# Altium footprint library ST封装.PcbLib: 1336 footprints (part 26 of 109) (continued)
## BGA127P39X39-1521 [mm] "BGA, 1521-Leads, Body 50x50mm, Pitch 1.27mm" (continued)
K35(19.05,12.7) K36(20.32,12.7) K37(21.59,12.7) K38(22.86,12.7) K39(24.13,12.7) L1(-24.13,11.43) L2(-22.86,11.43) L3(-21.59,11.43) L4(-20.32,11.43) L5(-19.05,11.43) L6(-17.78,11.43) L7(-16.51,11.43) L8(-15.24,11.43) L9(-13.97,11.43) L10(-12.7,11.43) L11(-11.43,11.43) L12(-10.16,11.43) L13(-8.89,11.43) L14(-7.62,11.43) L15(-6.35,11.43) L16(-5.08,11.43) L17(-3.81,11.43) L18(-2.54,11.43) L19(-1.27,11.43) L20(0,11.43) L21(1.27,11.43) L22(2.54,11.43) L23(3.81,11.43) L24(5.08,11.43) L25(6.35,11.43) L26(7.62,11.43) L27(8.89,11.43) L28(10.16,11.43) L29(11.43,11.43) L30(12.7,11.43) L31(13.97,11.43) L32(15.24,11.43) L33(16.51,11.43) L34(17.78,11.43) L35(19.05,11.43) L36(20.32,11.43) L37(21.59,11.43) L38(22.86,11.43) L39(24.13,11.43) M1(-24.13,10.16) M2(-22.86,10.16) M3(-21.59,10.16) M4(-20.32,10.16) M5(-19.05,10.16) M6(-17.78,10.16) M7(-16.51,10.16) M8(-15.24,10.16) M9(-13.97,10.16) M10(-12.7,10.16) M11(-11.43,10.16) M12(-10.16,10.16) M13(-8.89,10.16) M14(-7.62,10.16) M15(-6.35,10.16) M16(-5.08,10.16) M17(-3.81,10.16) M18(-2.54,10.16) M19(-1.27,10.16) M20(0,10.16) M21(1.27,10.16) M22(2.54,10.16) M23(3.81,10.16) M24(5.08,10.16) M25(6.35,10.16) M26(7.62,10.16) M27(8.89,10.16) M28(10.16,10.16) M29(11.43,10.16) M30(12.7,10.16) M31(13.97,10.16) M32(15.24,10.16) M33(16.51,10.16) M34(17.78,10.16) M35(19.05,10.16) M36(20.32,10.16) M37(21.59,10.16) M38(22.86,10.16) M39(24.13,10.16) N1(-24.13,8.89) N2(-22.86,8.89) N3(-21.59,8.89) N4(-20.32,8.89) N5(-19.05,8.89) N6(-17.78,8.89) N7(-16.51,8.89) N8(-15.24,8.89) N9(-13.97,8.89) N10(-12.7,8.89) N11(-11.43,8.89) N12(-10.16,8.89) N13(-8.89,8.89) N14(-7.62,8.89) N15(-6.35,8.89) N16(-5.08,8.89) N17(-3.81,8.89) N18(-2.54,8.89) N19(-1.27,8.89) N20(0,8.89) N21(1.27,8.89) N22(2.54,8.89) N23(3.81,8.89) N24(5.08,8.89) N25(6.35,8.89) N26(7.62,8.89) N27(8.89,8.89) N28(10.16,8.89) N29(11.43,8.89) N30(12.7,8.89) N31(13.97,8.89) N32(15.24,8.89) N33(16.51,8.89) N34(17.78,8.89) N35(19.05,8.89) N36(20.32,8.89) N37(21.59,8.89) N38(22.86,8.89) N39(24.13,8.89) P1(-24.13,7.62) P2(-22.86,7.62) P3(-21.59,7.62) P4(-20.32,7.62) P5(-19.05,7.62) P6(-17.78,7.62) P7(-16.51,7.62) P8(-15.24,7.62) P9(-13.97,7.62) P10(-12.7,7.62) P11(-11.43,7.62) P12(-10.16,7.62) P13(-8.89,7.62) P14(-7.62,7.62) P15(-6.35,7.62) P16(-5.08,7.62) P17(-3.81,7.62) P18(-2.54,7.62) P19(-1.27,7.62) P20(0,7.62) P21(1.27,7.62) P22(2.54,7.62) P23(3.81,7.62) P24(5.08,7.62) P25(6.35,7.62) P26(7.62,7.62) P27(8.89,7.62) P28(10.16,7.62) P29(11.43,7.62) P30(12.7,7.62) P31(13.97,7.62) P32(15.24,7.62) P33(16.51,7.62) P34(17.78,7.62) P35(19.05,7.62) P36(20.32,7.62) P37(21.59,7.62) P38(22.86,7.62) P39(24.13,7.62) R1(-24.13,6.35) R2(-22.86,6.35) R3(-21.59,6.35) R4(-20.32,6.35) R5(-19.05,6.35) R6(-17.78,6.35) R7(-16.51,6.35) R8(-15.24,6.35) R9(-13.97,6.35) R10(-12.7,6.35) R11(-11.43,6.35) R12(-10.16,6.35) R13(-8.89,6.35) R14(-7.62,6.35) R15(-6.35,6.35) R16(-5.08,6.35) R17(-3.81,6.35) R18(-2.54,6.35) R19(-1.27,6.35) R20(0,6.35) R21(1.27,6.35) R22(2.54,6.35) R23(3.81,6.35) R24(5.08,6.35) R25(6.35,6.35) R26(7.62,6.35) R27(8.89,6.35) R28(10.16,6.35) R29(11.43,6.35) R30(12.7,6.35) R31(13.97,6.35) R32(15.24,6.35) R33(16.51,6.35) R34(17.78,6.35) R35(19.05,6.35) R36(20.32,6.35) R37(21.59,6.35) R38(22.86,6.35) R39(24.13,6.35) T1(-24.13,5.08) T2(-22.86,5.08) T3(-21.59,5.08) T4(-20.32,5.08) T5(-19.05,5.08) T6(-17.78,5.08) T7(-16.51,5.08) T8(-15.24,5.08) T9(-13.97,5.08) T10(-12.7,5.08) T11(-11.43,5.08) T12(-10.16,5.08) T13(-8.89,5.08) T14(-7.62,5.08) T15(-6.35,5.08) T16(-5.08,5.08) T17(-3.81,5.08) T18(-2.54,5.08) T19(-1.27,5.08) T20(0,5.08) T21(1.27,5.08) T22(2.54,5.08) T23(3.81,5.08) T24(5.08,5.08) T25(6.35,5.08) T26(7.62,5.08) T27(8.89,5.08) T28(10.16,5.08) T29(11.43,5.08) T30(12.7,5.08) T31(13.97,5.08) T32(15.24,5.08) T33(16.51,5.08) T34(17.78,5.08) T35(19.05,5.08) T36(20.32,5.08) T37(21.59,5.08) T38(22.86,5.08) T39(24.13,5.08) U1(-24.13,3.81) U2(-22.86,3.81) U3(-21.59,3.81) U4(-20.32,3.81) U5(-19.05,3.81) U6(-17.78,3.81) U7(-16.51,3.81) U8(-15.24,3.81) U9(-13.97,3.81) U10(-12.7,3.81) U11(-11.43,3.81) U12(-10.16,3.81) U13(-8.89,3.81) U14(-7.62,3.81) U15(-6.35,3.81) U16(-5.08,3.81) U17(-3.81,3.81) U18(-2.54,3.81) U19(-1.27,3.81) U20(0,3.81) U21(1.27,3.81) U22(2.54,3.81) U23(3.81,3.81) U24(5.08,3.81) U25(6.35,3.81) U26(7.62,3.81) U27(8.89,3.81) U28(10.16,3.81) U29(11.43,3.81) U30(12.7,3.81) U31(13.97,3.81) U32(15.24,3.81) U33(16.51,3.81) U34(17.78,3.81) U35(19.05,3.81) U36(20.32,3.81) U37(21.59,3.81) U38(22.86,3.81) U39(24.13,3.81) V1(-24.13,2.54) V2(-22.86,2.54) V3(-21.59,2.54) V4(-20.32,2.54) V5(-19.05,2.54) V6(-17.78,2.54) V7(-16.51,2.54) V8(-15.24,2.54) V9(-13.97,2.54) V10(-12.7,2.54) V11(-11.43,2.54) V12(-10.16,2.54) V13(-8.89,2.54) V14(-7.62,2.54) V15(-6.35,2.54) V16(-5.08,2.54) V17(-3.81,2.54) V18(-2.54,2.54) V19(-1.27,2.54) V20(0,2.54) V21(1.27,2.54) V22(2.54,2.54) V23(3.81,2.54) V24(5.08,2.54) V25(6.35,2.54) V26(7.62,2.54) V27(8.89,2.54) V28(10.16,2.54) V29(11.43,2.54) V30(12.7,2.54) V31(13.97,2.54) V32(15.24,2.54) V33(16.51,2.54) V34(17.78,2.54) V35(19.05,2.54) V36(20.32,2.54) V37(21.59,2.54) V38(22.86,2.54) V39(24.13,2.54) W1(-24.13,1.27) W2(-22.86,1.27) W3(-21.59,1.27) W4(-20.32,1.27) W5(-19.05,1.27) W6(-17.78,1.27) W7(-16.51,1.27) W8(-15.24,1.27) W9(-13.97,1.27) W10(-12.7,1.27) W11(-11.43,1.27) W12(-10.16,1.27) W13(-8.89,1.27) W14(-7.62,1.27) W15(-6.35,1.27) W16(-5.08,1.27) W17(-3.81,1.27) W18(-2.54,1.27) W19(-1.27,1.27) W20(0,1.27) W21(1.27,1.27) W22(2.54,1.27) W23(3.81,1.27) W24(5.08,1.27) W25(6.35,1.27) W26(7.62,1.27) W27(8.89,1.27) W28(10.16,1.27) W29(11.43,1.27) W30(12.7,1.27) W31(13.97,1.27) W32(15.24,1.27) W33(16.51,1.27) W34(17.78,1.27) W35(19.05,1.27) W36(20.32,1.27) W37(21.59,1.27) W38(22.86,1.27) W39(24.13,1.27) Y1(-24.13,0) Y2(-22.86,0) Y3(-21.59,0) Y4(-20.32,0) Y5(-19.05,0) Y6(-17.78,0) Y7(-16.51,0) Y8(-15.24,0) Y9(-13.97,0) Y10(-12.7,0) Y11(-11.43,0) Y12(-10.16,0) Y13(-8.89,0) Y14(-7.62,0) Y15(-6.35,0) Y16(-5.08,0) Y17(-3.81,0) Y18(-2.54,0) Y19(-1.27,0) Y20(0,0) Y21(1.27,0) Y22(2.54,0) Y23(3.81,0) Y24(5.08,0) Y25(6.35,0) Y26(7.62,0) Y27(8.89,0) Y28(10.16,0) Y29(11.43,0) Y30(12.7,0) Y31(13.97,0) Y32(15.24,0) Y33(16.51,0) Y34(17.78,0) Y35(19.05,0) Y36(20.32,0) Y37(21.59,0) Y38(22.86,0) Y39(24.13,0)
Top Overlay:
  circle w0.25: c-25.65,24.13 r0.125
  region: -24.25,25 -25,24.25 -25,25
  lines w0.2: -25,24.25 -24.25,25 ; -25,-25 -25,25 25,25 25,-25 -25,-25
Mechanical 13:
  lines w0.1: -25,-25 -25,25 25,25 25,-25 -25,-25
Mechanical 15:
  lines w0.1: -0.5,0 0.5,0 ; 0,-0.5 0,0.5 ; -26,-26 -26,26 26,26 26,-26 -26,-26
3D body: height 3.5, standoff 0, extent -25,-25 25,25

## BGA150P3X3-9 [mm] "BGA, 9-Leads, Body 7x7mm, Pitch 1.5mm"
height 3.5
pads (9):
  round 0.6 smd: A1(-1.5,1.5) A2(0,1.5) A3(1.5,1.5) B1(-1.5,0) B2(0,0) B3(1.5,0) C1(-1.5,-1.5) C2(0,-1.5) C3(1.5,-1.5)
Top Overlay:
  circle w0.25: c-4.15,1.5 r0.125
  region: -2.5,3.5 -3.5,2.5 -3.5,3.5
  lines w0.2: -3.5,2.5 -2.5,3.5 ; -3.5,-3.5 3.5,-3.5 3.5,3.5 -3.5,3.5 -3.5,-3.5
Mechanical 13:
  lines w0.1: -3.5,-3.5 3.5,-3.5 3.5,3.5 -3.5,3.5 -3.5,-3.5
Mechanical 15:
  lines w0.1: -0.5,0 0.5,0 ; 0,-0.5 0,0.5 ; -4.5,-4.5 4.5,-4.5 4.5,4.5 -4.5,4.5 -4.5,-4.5
3D body: height 3.5, standoff 0, extent -3.5,-3.5 3.5,3.5

## BGA150P4X4-16 [mm] "BGA, 16-Leads, Body 7x7mm, Pitch 1.5mm"
height 3.5
pads (16):
  round 0.6 smd: A1(-2.25,2.25) A2(-0.75,2.25) A3(0.75,2.25) A4(2.25,2.25) B1(-2.25,0.75) B2(-0.75,0.75) B3(0.75,0.75) B4(2.25,0.75) C1(-2.25,-0.75) C2(-0.75,-0.75) C3(0.75,-0.75) C4(2.25,-0.75) D1(-2.25,-2.25) D2(-0.75,-2.25) D3(0.75,-2.25) D4(2.25,-2.25)
Top Overlay:
  circle w0.25: c-4.15,2.25 r0.125
  region: -2.5,3.5 -3.5,2.5 -3.5,3.5
  lines w0.2: -3.5,2.5 -2.5,3.5 ; -3.5,-3.5 -3.5,3.5 3.5,3.5 3.5,-3.5 -3.5,-3.5
Mechanical 13:
  lines w0.1: -3.5,-3.5 -3.5,3.5 3.5,3.5 3.5,-3.5 -3.5,-3.5
Mechanical 15:
  lines w0.1: -0.5,0 0.5,0 ; 0,-0.5 0,0.5 ; -4.5,-4.5 -4.5,4.5 4.5,4.5 4.5,-4.5 -4.5,-4.5
3D body: height 3.5, standoff 0, extent -3.5,-3.5 3.5,3.5

## BGA150P4X4-16A [mm] "BGA, 16-Leads, Body 8x8mm, Pitch 1.5mm"
height 3.5
pads (16):
  round 0.6 smd: A1(-2.25,2.25) A2(-0.75,2.25) A3(0.75,2.25) A4(2.25,2.25) B1(-2.25,0.75) B2(-0.75,0.75) B3(0.75,0.75) B4(2.25,0.75) C1(-2.25,-0.75) C2(-0.75,-0.75) C3(0.75,-0.75) C4(2.25,-0.75) D1(-2.25,-2.25) D2(-0.75,-2.25) D3(0.75,-2.25) D4(2.25,-2.25)
Top Overlay:
  circle w0.25: c-4.65,2.25 r0.125
  region: -3,4 -4,3 -4,4
  lines w0.2: -4,3 -3,4 ; -4,-4 4,-4 4,4 -4,4 -4,-4
Mechanical 13:
  lines w0.1: -4,-4 4,-4 4,4 -4,4 -4,-4
Mechanical 15:
  lines w0.1: -0.5,0 0.5,0 ; 0,-0.5 0,0.5 ; -5,-5 5,-5 5,5 -5,5 -5,-5
3D body: height 3.5, standoff 0, extent -4,-4 4,4

## BGA150P5X5-25 [mm] "BGA, 25-Leads, Body 8x8mm, Pitch 1.5mm"
height 3.5
pads (25):
  round 0.6 smd: A1(-3,3) A2(-1.5,3) A3(0,3) A4(1.5,3) A5(3,3) B1(-3,1.5) B2(-1.5,1.5) B3(0,1.5) B4(1.5,1.5) B5(3,1.5) C1(-3,0) C2(-1.5,0) C3(0,0) C4(1.5,0) C5(3,0) D1(-3,-1.5) D2(-1.5,-1.5) D3(0,-1.5) D4(1.5,-1.5) D5(3,-1.5) E1(-3,-3) E2(-1.5,-3) E3(0,-3) E4(1.5,-3) E5(3,-3)
Top Overlay:
  circle w0.25: c-4.65,3 r0.125
  region: -3,4 -4,3 -4,4
  lines w0.2: -4,3 -3,4 ; -4,-4 4,-4 4,4 -4,4 -4,-4
Mechanical 13:
  lines w0.1: -4,-4 4,-4 4,4 -4,4 -4,-4
Mechanical 15:
  lines w0.1: -0.5,0 0.5,0 ; 0,-0.5 0,0.5 ; -5,-5 5,-5 5,5 -5,5 -5,-5
3D body: height 3.5, standoff 0, extent -4,-4 4,4

## BGA150P5X5-25A [mm] "BGA, 25-Leads, Body 9x9mm, Pitch 1.5mm"
height 3.5
pads (25):
  round 0.6 smd: A1(-3,3) A2(-1.5,3) A3(0,3) A4(1.5,3) A5(3,3) B1(-3,1.5) B2(-1.5,1.5) B3(0,1.5) B4(1.5,1.5) B5(3,1.5) C1(-3,0) C2(-1.5,0) C3(0,0) C4(1.5,0) C5(3,0) D1(-3,-1.5) D2(-1.5,-1.5) D3(0,-1.5) D4(1.5,-1.5) D5(3,-1.5) E1(-3,-3) E2(-1.5,-3) E3(0,-3) E4(1.5,-3) E5(3,-3)
Top Overlay:
  circle w0.25: c-5.15,3 r0.125
  region: -3.5,4.5 -4.5,3.5 -4.5,4.5
  lines w0.2: -4.5,3.5 -3.5,4.5 ; -4.5,-4.5 -4.5,4.5 4.5,4.5 4.5,-4.5 -4.5,-4.5
Mechanical 13:
  lines w0.1: -4.5,-4.5 -4.5,4.5 4.5,4.5 4.5,-4.5 -4.5,-4.5
Mechanical 15:
  lines w0.1: -0.5,0 0.5,0 ; 0,-0.5 0,0.5 ; -5.5,-5.5 -5.5,5.5 5.5,5.5 5.5,-5.5 -5.5,-5.5
3D body: height 3.5, standoff 0, extent -4.5,-4.5 4.5,4.5

## BGA150P5X5-25B [mm] "BGA, 25-Leads, Body 10x10mm, Pitch 1.5mm"
height 3.5
pads (25):
  round 0.6 smd: A1(-3,3) A2(-1.5,3) A3(0,3) A4(1.5,3) A5(3,3) B1(-3,1.5) B2(-1.5,1.5) B3(0,1.5) B4(1.5,1.5) B5(3,1.5) C1(-3,0) C2(-1.5,0) C3(0,0) C4(1.5,0) C5(3,0) D1(-3,-1.5) D2(-1.5,-1.5) D3(0,-1.5) D4(1.5,-1.5) D5(3,-1.5) E1(-3,-3) E2(-1.5,-3) E3(0,-3) E4(1.5,-3) E5(3,-3)
Top Overlay:
  circle w0.25: c-5.65,3 r0.125
  region: -4,5 -5,4 -5,5
  lines w0.2: -5,4 -4,5 ; -5,-5 -5,5 5,5 5,-5 -5,-5
Mechanical 13:
  lines w0.1: -5,-5 -5,5 5,5 5,-5 -5,-5
Mechanical 15:
  lines w0.1: -0.5,0 0.5,0 ; 0,-0.5 0,0.5 ; -6,-6 -6,6 6,6 6,-6 -6,-6
3D body: height 3.5, standoff 0, extent -5,-5 5,5

## BGA150P6X6-36 [mm] "BGA, 36-Leads, Body 9x9mm, Pitch 1.5mm"
height 3.5
pads (36):
  round 0.6 smd: A1(-3.75,3.75) A2(-2.25,3.75) A3(-0.75,3.75) A4(0.75,3.75) A5(2.25,3.75) A6(3.75,3.75) B1(-3.75,2.25) B2(-2.25,2.25) B3(-0.75,2.25) B4(0.75,2.25) B5(2.25,2.25) B6(3.75,2.25) C1(-3.75,0.75) C2(-2.25,0.75) C3(-0.75,0.75) C4(0.75,0.75) C5(2.25,0.75) C6(3.75,0.75) D1(-3.75,-0.75) D2(-2.25,-0.75) D3(-0.75,-0.75) D4(0.75,-0.75) D5(2.25,-0.75) D6(3.75,-0.75) E1(-3.75,-2.25) E2(-2.25,-2.25) E3(-0.75,-2.25) E4(0.75,-2.25) E5(2.25,-2.25) E6(3.75,-2.25) F1(-3.75,-3.75) F2(-2.25,-3.75) F3(-0.75,-3.75) F4(0.75,-3.75) F5(2.25,-3.75) F6(3.75,-3.75)
Top Overlay:
  circle w0.25: c-5.15,3.75 r0.125
  region: -3.99,4.5 -4.5,3.99 -4.5,4.5
  lines w0.2: -4.5,3.99 -3.99,4.5 ; -4.5,-4.5 -4.5,4.5 4.5,4.5 4.5,-4.5 -4.5,-4.5
Mechanical 13:
  lines w0.1: -4.5,-4.5 -4.5,4.5 4.5,4.5 4.5,-4.5 -4.5,-4.5
Mechanical 15:
  lines w0.1: -0.5,0 0.5,0 ; 0,-0.5 0,0.5 ; -5.5,-5.5 -5.5,5.5 5.5,5.5 5.5,-5.5 -5.5,-5.5
3D body: height 3.5, standoff 0, extent -4.5,-4.5 4.5,4.5

## BGA150P6X6-36A [mm] "BGA, 36-Leads, Body 10x10mm, Pitch 1.5mm"
height 3.5
pads (36):
  round 0.6 smd: A1(-3.75,3.75) A2(-2.25,3.75) A3(-0.75,3.75) A4(0.75,3.75) A5(2.25,3.75) A6(3.75,3.75) B1(-3.75,2.25) B2(-2.25,2.25) B3(-0.75,2.25) B4(0.75,2.25) B5(2.25,2.25) B6(3.75,2.25) C1(-3.75,0.75) C2(-2.25,0.75) C3(-0.75,0.75) C4(0.75,0.75) C5(2.25,0.75) C6(3.75,0.75) D1(-3.75,-0.75) D2(-2.25,-0.75) D3(-0.75,-0.75) D4(0.75,-0.75) D5(2.25,-0.75) D6(3.75,-0.75) E1(-3.75,-2.25) E2(-2.25,-2.25) E3(-0.75,-2.25) E4(0.75,-2.25) E5(2.25,-2.25) E6(3.75,-2.25) F1(-3.75,-3.75) F2(-2.25,-3.75) F3(-0.75,-3.75) F4(0.75,-3.75) F5(2.25,-3.75) F6(3.75,-3.75)
Top Overlay:
  circle w0.25: c-5.65,3.75 r0.125
  region: -4,5 -5,4 -5,5
  lines w0.2: -5,4 -4,5 ; -5,-5 -5,5 5,5 5,-5 -5,-5
Mechanical 13:
  lines w0.1: -5,-5 -5,5 5,5 5,-5 -5,-5
Mechanical 15:
  lines w0.1: -0.5,0 0.5,0 ; 0,-0.5 0,0.5 ; -6,-6 -6,6 6,6 6,-6 -6,-6
3D body: height 3.5, standoff 0, extent -5,-5 5,5

## BGA150P6X6-36B [mm] "BGA, 36-Leads, Body 11x11mm, Pitch 1.5mm"
height 3.5
pads (36):
  round 0.6 smd: A1(-3.75,3.75) A2(-2.25,3.75) A3(-0.75,3.75) A4(0.75,3.75) A5(2.25,3.75) A6(3.75,3.75) B1(-3.75,2.25) B2(-2.25,2.25) B3(-0.75,2.25) B4(0.75,2.25) B5(2.25,2.25) B6(3.75,2.25) C1(-3.75,0.75) C2(-2.25,0.75) C3(-0.75,0.75) C4(0.75,0.75) C5(2.25,0.75) C6(3.75,0.75) D1(-3.75,-0.75) D2(-2.25,-0.75) D3(-0.75,-0.75) D4(0.75,-0.75) D5(2.25,-0.75) D6(3.75,-0.75) E1(-3.75,-2.25) E2(-2.25,-2.25) E3(-0.75,-2.25) E4(0.75,-2.25) E5(2.25,-2.25) E6(3.75,-2.25) F1(-3.75,-3.75) F2(-2.25,-3.75) F3(-0.75,-3.75) F4(0.75,-3.75) F5(2.25,-3.75) F6(3.75,-3.75)
Top Overlay:
  circle w0.25: c-6.15,3.75 r0.125
  region: -4.5,5.5 -5.5,4.5 -5.5,5.5
  lines w0.2: -5.5,4.5 -4.5,5.5 ; -5.5,-5.5 -5.5,5.5 5.5,5.5 5.5,-5.5 -5.5,-5.5
Mechanical 13:
  lines w0.1: -5.5,-5.5 -5.5,5.5 5.5,5.5 5.5,-5.5 -5.5,-5.5
Mechanical 15:
  lines w0.1: -0.5,0 0.5,0 ; 0,-0.5 0,0.5 ; -6.5,-6.5 -6.5,6.5 6.5,6.5 6.5,-6.5 -6.5,-6.5
3D body: height 3.5, standoff 0, extent -5.5,-5.5 5.5,5.5

## BGA150P7X7-49 [mm] "BGA, 49-Leads, Body 11x11mm, Pitch 1.5mm"
height 3.5
pads (49):
  round 0.6 smd: A1(-4.5,4.5) A2(-3,4.5) A3(-1.5,4.5) A4(0,4.5) A5(1.5,4.5) A6(3,4.5) A7(4.5,4.5) B1(-4.5,3) B2(-3,3) B3(-1.5,3) B4(0,3) B5(1.5,3) B6(3,3) B7(4.5,3) C1(-4.5,1.5) C2(-3,1.5) C3(-1.5,1.5) C4(0,1.5) C5(1.5,1.5) C6(3,1.5) C7(4.5,1.5) D1(-4.5,0) D2(-3,0) D3(-1.5,0) D4(0,0) D5(1.5,0) D6(3,0) D7(4.5,0) E1(-4.5,-1.5) E2(-3,-1.5) E3(-1.5,-1.5) E4(0,-1.5) E5(1.5,-1.5) E6(3,-1.5) E7(4.5,-1.5) F1(-4.5,-3) F2(-3,-3) F3(-1.5,-3) F4(0,-3) F5(1.5,-3) F6(3,-3) F7(4.5,-3) G1(-4.5,-4.5) G2(-3,-4.5) G3(-1.5,-4.5) G4(0,-4.5) G5(1.5,-4.5) G6(3,-4.5) G7(4.5,-4.5)
Top Overlay:
  circle w0.25: c-6.15,4.5 r0.125
  region: -4.5,5.5 -5.5,4.5 -5.5,5.5
  lines w0.2: -5.5,4.5 -4.5,5.5 ; -5.5,-5.5 5.5,-5.5 5.5,5.5 -5.5,5.5 -5.5,-5.5
Mechanical 13:
  lines w0.1: -5.5,-5.5 5.5,-5.5 5.5,5.5 -5.5,5.5 -5.5,-5.5
Mechanical 15:
  lines w0.1: -0.5,0 0.5,0 ; 0,-0.5 0,0.5 ; -6.5,-6.5 6.5,-6.5 6.5,6.5 -6.5,6.5 -6.5,-6.5
3D body: height 3.5, standoff 0, extent -5.5,-5.5 5.5,5.5

## BGA150P7X7-49A [mm] "BGA, 49-Leads, Body 12x12mm, Pitch 1.5mm"
height 3.5
pads (49):
  round 0.6 smd: A1(-4.5,4.5) A2(-3,4.5) A3(-1.5,4.5) A4(0,4.5) A5(1.5,4.5) A6(3,4.5) A7(4.5,4.5) B1(-4.5,3) B2(-3,3) B3(-1.5,3) B4(0,3) B5(1.5,3) B6(3,3) B7(4.5,3) C1(-4.5,1.5) C2(-3,1.5) C3(-1.5,1.5) C4(0,1.5) C5(1.5,1.5) C6(3,1.5) C7(4.5,1.5) D1(-4.5,0) D2(-3,0) D3(-1.5,0) D4(0,0) D5(1.5,0) D6(3,0) D7(4.5,0) E1(-4.5,-1.5) E2(-3,-1.5) E3(-1.5,-1.5) E4(0,-1.5) E5(1.5,-1.5) E6(3,-1.5) E7(4.5,-1.5) F1(-4.5,-3) F2(-3,-3) F3(-1.5,-3) F4(0,-3) F5(1.5,-3) F6(3,-3) F7(4.5,-3) G1(-4.5,-4.5) G2(-3,-4.5) G3(-1.5,-4.5) G4(0,-4.5) G5(1.5,-4.5) G6(3,-4.5) G7(4.5,-4.5)
Top Overlay:
  circle w0.25: c-6.65,4.5 r0.125
  region: -5,6 -6,5 -6,6
  lines w0.2: -6,5 -5,6 ; -6,-6 6,-6 6,6 -6,6 -6,-6
Mechanical 13:
  lines w0.1: -6,-6 6,-6 6,6 -6,6 -6,-6
Mechanical 15:
  lines w0.1: -0.5,0 0.5,0 ; 0,-0.5 0,0.5 ; -7,-7 7,-7 7,7 -7,7 -7,-7
3D body: height 3.5, standoff 0, extent -6,-6 6,6

## BGA150P7X7-49B [mm] "BGA, 49-Leads, Body 13x13mm, Pitch 1.5mm"
height 3.5
pads (49):
  round 0.6 smd: A1(-4.5,4.5) A2(-3,4.5) A3(-1.5,4.5) A4(0,4.5) A5(1.5,4.5) A6(3,4.5) A7(4.5,4.5) B1(-4.5,3) B2(-3,3) B3(-1.5,3) B4(0,3) B5(1.5,3) B6(3,3) B7(4.5,3) C1(-4.5,1.5) C2(-3,1.5) C3(-1.5,1.5) C4(0,1.5) C5(1.5,1.5) C6(3,1.5) C7(4.5,1.5) D1(-4.5,0) D2(-3,0) D3(-1.5,0) D4(0,0) D5(1.5,0) D6(3,0) D7(4.5,0) E1(-4.5,-1.5) E2(-3,-1.5) E3(-1.5,-1.5) E4(0,-1.5) E5(1.5,-1.5) E6(3,-1.5) E7(4.5,-1.5) F1(-4.5,-3) F2(-3,-3) F3(-1.5,-3) F4(0,-3) F5(1.5,-3) F6(3,-3) F7(4.5,-3) G1(-4.5,-4.5) G2(-3,-4.5) G3(-1.5,-4.5) G4(0,-4.5) G5(1.5,-4.5) G6(3,-4.5) G7(4.5,-4.5)
Top Overlay:
  circle w0.25: c-7.15,4.5 r0.125
  region: -5.5,6.5 -6.5,5.5 -6.5,6.5
  lines w0.2: -6.5,5.5 -5.5,6.5 ; -6.5,-6.5 6.5,-6.5 6.5,6.5 -6.5,6.5 -6.5,-6.5
Mechanical 13:
  lines w0.1: -6.5,-6.5 6.5,-6.5 6.5,6.5 -6.5,6.5 -6.5,-6.5
Mechanical 15:
  lines w0.1: -0.5,0 0.5,0 ; 0,-0.5 0,0.5 ; -7.5,-7.5 7.5,-7.5 7.5,7.5 -7.5,7.5 -7.5,-7.5
3D body: height 3.5, standoff 0, extent -6.5,-6.5 6.5,6.5

## BGA150P8X8-64 [mm] "BGA, 64-Leads, Body 12x12mm, Pitch 1.5mm"
height 3.5
pads (64):
  round 0.6 smd: A1(-5.25,5.25) A2(-3.75,5.25) A3(-2.25,5.25) A4(-0.75,5.25) A5(0.75,5.25) A6(2.25,5.25) A7(3.75,5.25) A8(5.25,5.25) B1(-5.25,3.75) B2(-3.75,3.75) B3(-2.25,3.75) B4(-0.75,3.75) B5(0.75,3.75) B6(2.25,3.75) B7(3.75,3.75) B8(5.25,3.75) C1(-5.25,2.25) C2(-3.75,2.25) C3(-2.25,2.25) C4(-0.75,2.25) C5(0.75,2.25) C6(2.25,2.25) C7(3.75,2.25) C8(5.25,2.25) D1(-5.25,0.75) D2(-3.75,0.75) D3(-2.25,0.75) D4(-0.75,0.75) D5(0.75,0.75) D6(2.25,0.75) D7(3.75,0.75) D8(5.25,0.75) E1(-5.25,-0.75) E2(-3.75,-0.75) E3(-2.25,-0.75) E4(-0.75,-0.75) E5(0.75,-0.75) E6(2.25,-0.75) E7(3.75,-0.75) E8(5.25,-0.75) F1(-5.25,-2.25) F2(-3.75,-2.25) F3(-2.25,-2.25) F4(-0.75,-2.25) F5(0.75,-2.25) F6(2.25,-2.25) F7(3.75,-2.25) F8(5.25,-2.25) G1(-5.25,-3.75) G2(-3.75,-3.75) G3(-2.25,-3.75) G4(-0.75,-3.75) G5(0.75,-3.75) G6(2.25,-3.75) G7(3.75,-3.75) G8(5.25,-3.75) H1(-5.25,-5.25) H2(-3.75,-5.25) H3(-2.25,-5.25) H4(-0.75,-5.25) H5(0.75,-5.25) H6(2.25,-5.25) H7(3.75,-5.25) H8(5.25,-5.25)
Top Overlay:
  circle w0.25: c-6.65,5.25 r0.125
  region: -5.49,6 -6,5.49 -6,6
  lines w0.2: -6,5.49 -5.49,6 ; -6,-6 6,-6 6,6 -6,6 -6,-6
Mechanical 13:
  lines w0.1: -6,-6 6,-6 6,6 -6,6 -6,-6
Mechanical 15:
  lines w0.1: -0.5,0 0.5,0 ; 0,-0.5 0,0.5 ; -7,-7 7,-7 7,7 -7,7 -7,-7
3D body: height 3.5, standoff 0, extent -6,-6 6,6

## BGA150P8X8-64A [mm] "BGA, 64-Leads, Body 13x13mm, Pitch 1.5mm"
height 3.5
pads (64):
  round 0.6 smd: A1(-5.25,5.25) A2(-3.75,5.25) A3(-2.25,5.25) A4(-0.75,5.25) A5(0.75,5.25) A6(2.25,5.25) A7(3.75,5.25) A8(5.25,5.25) B1(-5.25,3.75) B2(-3.75,3.75) B3(-2.25,3.75) B4(-0.75,3.75) B5(0.75,3.75) B6(2.25,3.75) B7(3.75,3.75) B8(5.25,3.75) C1(-5.25,2.25) C2(-3.75,2.25) C3(-2.25,2.25) C4(-0.75,2.25) C5(0.75,2.25) C6(2.25,2.25) C7(3.75,2.25) C8(5.25,2.25) D1(-5.25,0.75) D2(-3.75,0.75) D3(-2.25,0.75) D4(-0.75,0.75) D5(0.75,0.75) D6(2.25,0.75) D7(3.75,0.75) D8(5.25,0.75) E1(-5.25,-0.75) E2(-3.75,-0.75) E3(-2.25,-0.75) E4(-0.75,-0.75) E5(0.75,-0.75) E6(2.25,-0.75) E7(3.75,-0.75) E8(5.25,-0.75) F1(-5.25,-2.25) F2(-3.75,-2.25) F3(-2.25,-2.25) F4(-0.75,-2.25) F5(0.75,-2.25) F6(2.25,-2.25) F7(3.75,-2.25) F8(5.25,-2.25) G1(-5.25,-3.75) G2(-3.75,-3.75) G3(-2.25,-3.75) G4(-0.75,-3.75) G5(0.75,-3.75) G6(2.25,-3.75) G7(3.75,-3.75) G8(5.25,-3.75) H1(-5.25,-5.25) H2(-3.75,-5.25) H3(-2.25,-5.25) H4(-0.75,-5.25) H5(0.75,-5.25) H6(2.25,-5.25) H7(3.75,-5.25) H8(5.25,-5.25)
Top Overlay:
  circle w0.25: c-7.15,5.25 r0.125
  region: -5.5,6.5 -6.5,5.5 -6.5,6.5
  lines w0.2: -6.5,5.5 -5.5,6.5 ; -6.5,-6.5 6.5,-6.5 6.5,6.5 -6.5,6.5 -6.5,-6.5
Mechanical 13:
  lines w0.1: -6.5,-6.5 6.5,-6.5 6.5,6.5 -6.5,6.5 -6.5,-6.5
Mechanical 15:
  lines w0.1: -0.5,0 0.5,0 ; 0,-0.5 0,0.5 ; -7.5,-7.5 7.5,-7.5 7.5,7.5 -7.5,7.5 -7.5,-7.5
3D body: height 3.5, standoff 0, extent -6.5,-6.5 6.5,6.5

## BGA150P8X8-64B [mm] "BGA, 64-Leads, Body 14x14mm, Pitch 1.5mm"
height 3.5
pads (64):
  round 0.6 smd: A1(-5.25,5.25) A2(-3.75,5.25) A3(-2.25,5.25) A4(-0.75,5.25) A5(0.75,5.25) A6(2.25,5.25) A7(3.75,5.25) A8(5.25,5.25) B1(-5.25,3.75) B2(-3.75,3.75) B3(-2.25,3.75) B4(-0.75,3.75) B5(0.75,3.75) B6(2.25,3.75) B7(3.75,3.75) B8(5.25,3.75) C1(-5.25,2.25) C2(-3.75,2.25) C3(-2.25,2.25) C4(-0.75,2.25) C5(0.75,2.25) C6(2.25,2.25) C7(3.75,2.25) C8(5.25,2.25) D1(-5.25,0.75) D2(-3.75,0.75) D3(-2.25,0.75) D4(-0.75,0.75) D5(0.75,0.75) D6(2.25,0.75) D7(3.75,0.75) D8(5.25,0.75) E1(-5.25,-0.75) E2(-3.75,-0.75) E3(-2.25,-0.75) E4(-0.75,-0.75) E5(0.75,-0.75) E6(2.25,-0.75) E7(3.75,-0.75) E8(5.25,-0.75) F1(-5.25,-2.25) F2(-3.75,-2.25) F3(-2.25,-2.25) F4(-0.75,-2.25) F5(0.75,-2.25) F6(2.25,-2.25) F7(3.75,-2.25) F8(5.25,-2.25) G1(-5.25,-3.75) G2(-3.75,-3.75) G3(-2.25,-3.75) G4(-0.75,-3.75) G5(0.75,-3.75) G6(2.25,-3.75) G7(3.75,-3.75) G8(5.25,-3.75) H1(-5.25,-5.25) H2(-3.75,-5.25) H3(-2.25,-5.25) H4(-0.75,-5.25) H5(0.75,-5.25) H6(2.25,-5.25) H7(3.75,-5.25) H8(5.25,-5.25)
Top Overlay:
  circle w0.25: c-7.65,5.25 r0.125
  region: -6,7 -7,6 -7,7
  lines w0.2: -7,6 -6,7 ; -7,-7 7,-7 7,7 -7,7 -7,-7
Mechanical 13:
  lines w0.1: -7,-7 7,-7 7,7 -7,7 -7,-7
Mechanical 15:
  lines w0.1: -0.5,0 0.5,0 ; 0,-0.5 0,0.5 ; -8,-8 8,-8 8,8 -8,8 -8,-8
3D body: height 3.5, standoff 0, extent -7,-7 7,7